# Altium footprint library _components.PcbLib: 53 footprints (part 4 of 4)
Each footprint in its own frame and in the unit in brackets; x right, y up, seen from the top. Pads: shape width x height; smd on the part's side, far side on the other; paste and mask are expansions set on the pad; w line width, h text height; cw(c..) or ccw(c..) is an arc to the next point about the centre after c.
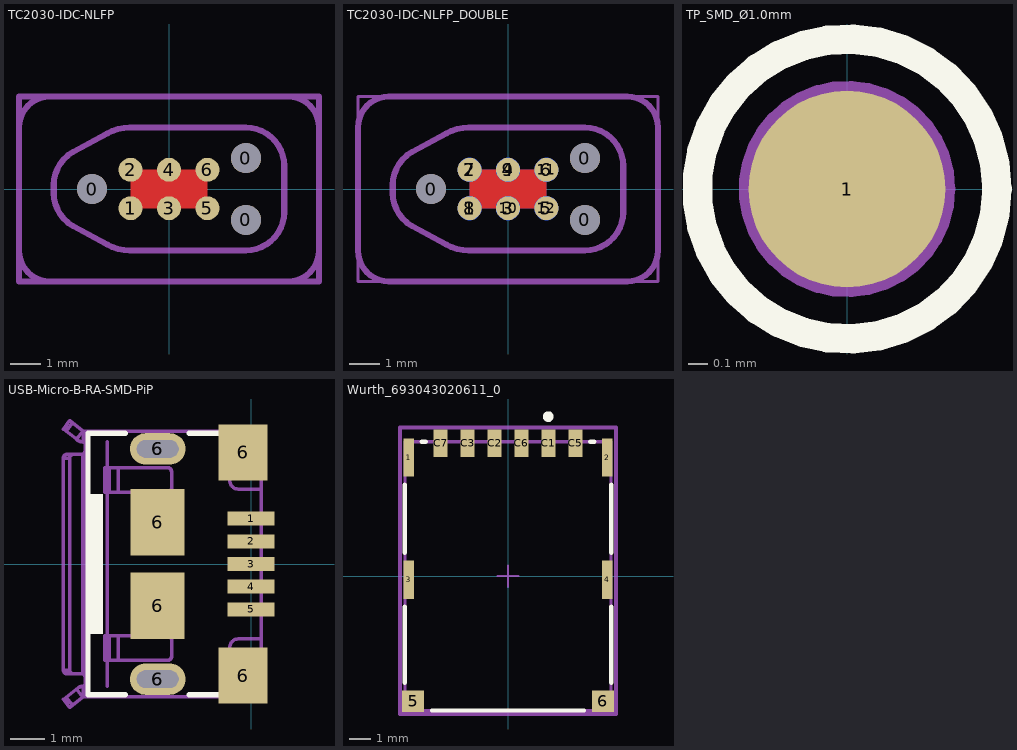
[diagram p3: the footprints below, top view; thin cyan lines are the x and y axes]

## TC2030-IDC-NLFP [mil]
pads (9):
  round 39 hole 39 unplated: 0(-100,0) 0(100,-40) 0(100,40)
  round 31 smd paste-196.85: 1(-50,-25) 2(-50,25) 3(0,-25) 4(0,25) 5(50,-25) 6(50,25)
Top Layer:
  pour cut-out: -50,25 -50,-25 50,-25 50,25
Top Assembly Info:
  lines w7.87: 99.96,-79.92 -51,-80 cw(c-51,-21.41) -80.29,-72.15 -124.92,-48.17 cw(c-100,-5) -149.84,-5 -149.84,5 cw(c-100,5) -124.92,48.17 -80.29,72.15 cw(c-51,21.41) -51,80 100,79.92 ; 99.96,-79.8 ccw(c99.96,-29.96) 149.8,-30 149.8,30 ccw(c99.96,30) 100,79.84 ; -195,-80 ccw(c-155,-80) -155,-120 155,-120 ccw(c155,-80) 195,-80 195,80 ccw(c155,80) 155,120 -155,120 ccw(c-155,80) -195,80 -195,-80
Top Placement:
  lines w3.94: -19.68,0 19.69,0 ; 0,-19.68 0,19.69
  lines w7.87: -195,-120 195,-120 195,120 -195,120 -195,-120

## TC2030-IDC-NLFP_DOUBLE [mil]
pads (15):
  round 39 hole 39 unplated: 0(-100,0) 0(100,-40) 0(100,40)
  round 31 smd paste-196.85: 1(-50,-25) 2(-50,25) 3(0,-25) 4(0,25) 5(50,-25) 6(50,25)
  round 31 smd far side paste-196.85: 7(-50,25) 8(-50,-25) 9(0,25) 10(0,-25) 11(50,25) 12(50,-25)
Top Layer:
  pour cut-out: -50,25 -50,-25 50,-25 50,25
Bottom Layer:
  pour cut-out: -50,-25 -50,25 50,25 50,-25
Top Assembly Info:
  lines w7.87: 99.96,-79.92 -51,-80 cw(c-51,-21.41) -80.29,-72.15 -124.92,-48.17 cw(c-100,-5) -149.84,-5 -149.84,5 cw(c-100,5) -124.92,48.17 -80.29,72.15 cw(c-51,21.41) -51,80 100,79.92 ; 99.96,-79.8 ccw(c99.96,-29.96) 149.8,-30 149.8,30 ccw(c99.96,30) 100,79.84 ; -195,-80 ccw(c-155,-80) -155,-120 155,-120 ccw(c155,-80) 195,-80 195,80 ccw(c155,80) 155,120 -155,120 ccw(c-155,80) -195,80 -195,-80
Top Placement:
  lines w3.94: -19.68,0 19.69,0 ; 0,-19.68 0,19.69 ; -195,-120 195,-120 195,120 -195,120 -195,-120

## TP_SMD_Ø1.0mm [mm]
pads (1):
  round 1 smd paste-5: 1(0,0)
Top Overlay:
  circle w0.15: c0,0 r0.762
Top Assembly Info:
  circle w0.1: c0,0 r0.5
  circle w0.1: c0,0 r0.762
  text ".Designator" at -0.633,0.918 h0.38

## USB-Micro-B-RA-SMD-PiP [mm]
pads (13):
  rect 1.35x0.4 smd: 1(0,1.3) 2(0,0.65) 3(0,0) 4(0,-0.65) 5(0,-1.3)
  oval 1.6x0.9 hole 0.5 slot 1.2 at 0 deg: 6(-2.675,-3.3) 6(-2.675,3.3)
  oval 2x1.5 on Top Paste: 6(-2.675,-3.3) 6(-2.675,3.3)
  rect 1.55x1.9 smd: 6(-2.675,-1.2) 6(-2.675,1.2)
  rect 1.4x1.6 smd: 6(-0.225,-3.2) 6(-0.225,3.2)
Top Overlay:
  rectangle: -4.75,-2 -4.25,2
  lines w0.152: -3.6,-3.75 -4.675,-3.75 -4.675,3.75 -3.6,3.75 ; -1.775,-3.75 0.25,-3.75 0.25,-3.275 ; -1.775,3.75 0.25,3.75 0.25,3.275
Top Component Info:
  lines w0.1: -4.125,-3.5 -4.125,3.5
  text "PCB edge" at -4.6,-1.916 h0.5
Top Assembly Info:
  drawing of 2738 lines, arcs and shapes, not listed
  text ".Designator" at -4.125,-0.127 h0.38
Top Placement:
  lines w0.1: -4.125,-3.5 -4.125,3.5
3D body "10118193-0001LF--3DModel-STEP-56544.STEP": height 2.84, standoff -0.76, extent -5.434,-3.935 0.276,3.925

## Wurth_693043020611_0 [mm] "Nano SIM connector"
height 1.2
pads (12):
  rect 0.48x1.8 smd: 1(-4.67,5.58) 2(4.67,5.58) 3(-4.67,-0.17) 4(4.67,-0.17)
  rect 1.03x1 smd: 5(-4.465,-5.89) 6(4.465,-5.89)
  rect 0.65x1.3 smd: C1(1.905,6.25) C2(-0.635,6.25) C3(-1.905,6.25) C5(3.175,6.25) C6(0.635,6.25) C7(-3.175,6.25)
Top Overlay:
  circle w0.25: c1.895,7.505 r0.125
  lines w0.2: -4.855,-5.015 -4.855,-1.445 ; -4.855,1.105 -4.855,4.305 ; -4.055,6.325 -3.875,6.325 ; -3.575,-6.325 3.575,-6.325 ; 3.875,6.325 4.055,6.325 ; 4.855,-5.015 4.855,-1.445 ; 4.855,1.105 4.855,4.305
Top Assembly Info:
  lines w0.15: -4.855,-6.325 -4.855,6.325 4.855,6.325 4.855,-6.325 -4.855,-6.325
Top Placement:
  lines w0.1: -0.5,0 0.5,0 ; 0,-0.5 0,0.5
  lines w0.2: -5.08,-6.49 5.08,-6.49 5.08,7 -5.08,7 -5.08,-6.49
3D body "Conn_Wurth_Electronics_Inc._693043020611_eec.STEP": height 0.25, standoff 0, extent -5.08,-6.49 5.08,7